# Altium footprint library 2.52-直插元件.PcbLib: 467 footprints (part 15 of 30)
Each footprint in its own frame and in the unit in brackets; x right, y up, seen from the top. Pads: shape width x height; smd on the part's side, far side on the other; paste and mask are expansions set on the pad; w line width, h text height; cw(c..) or ccw(c..) is an arc to the next point about the centre after c.
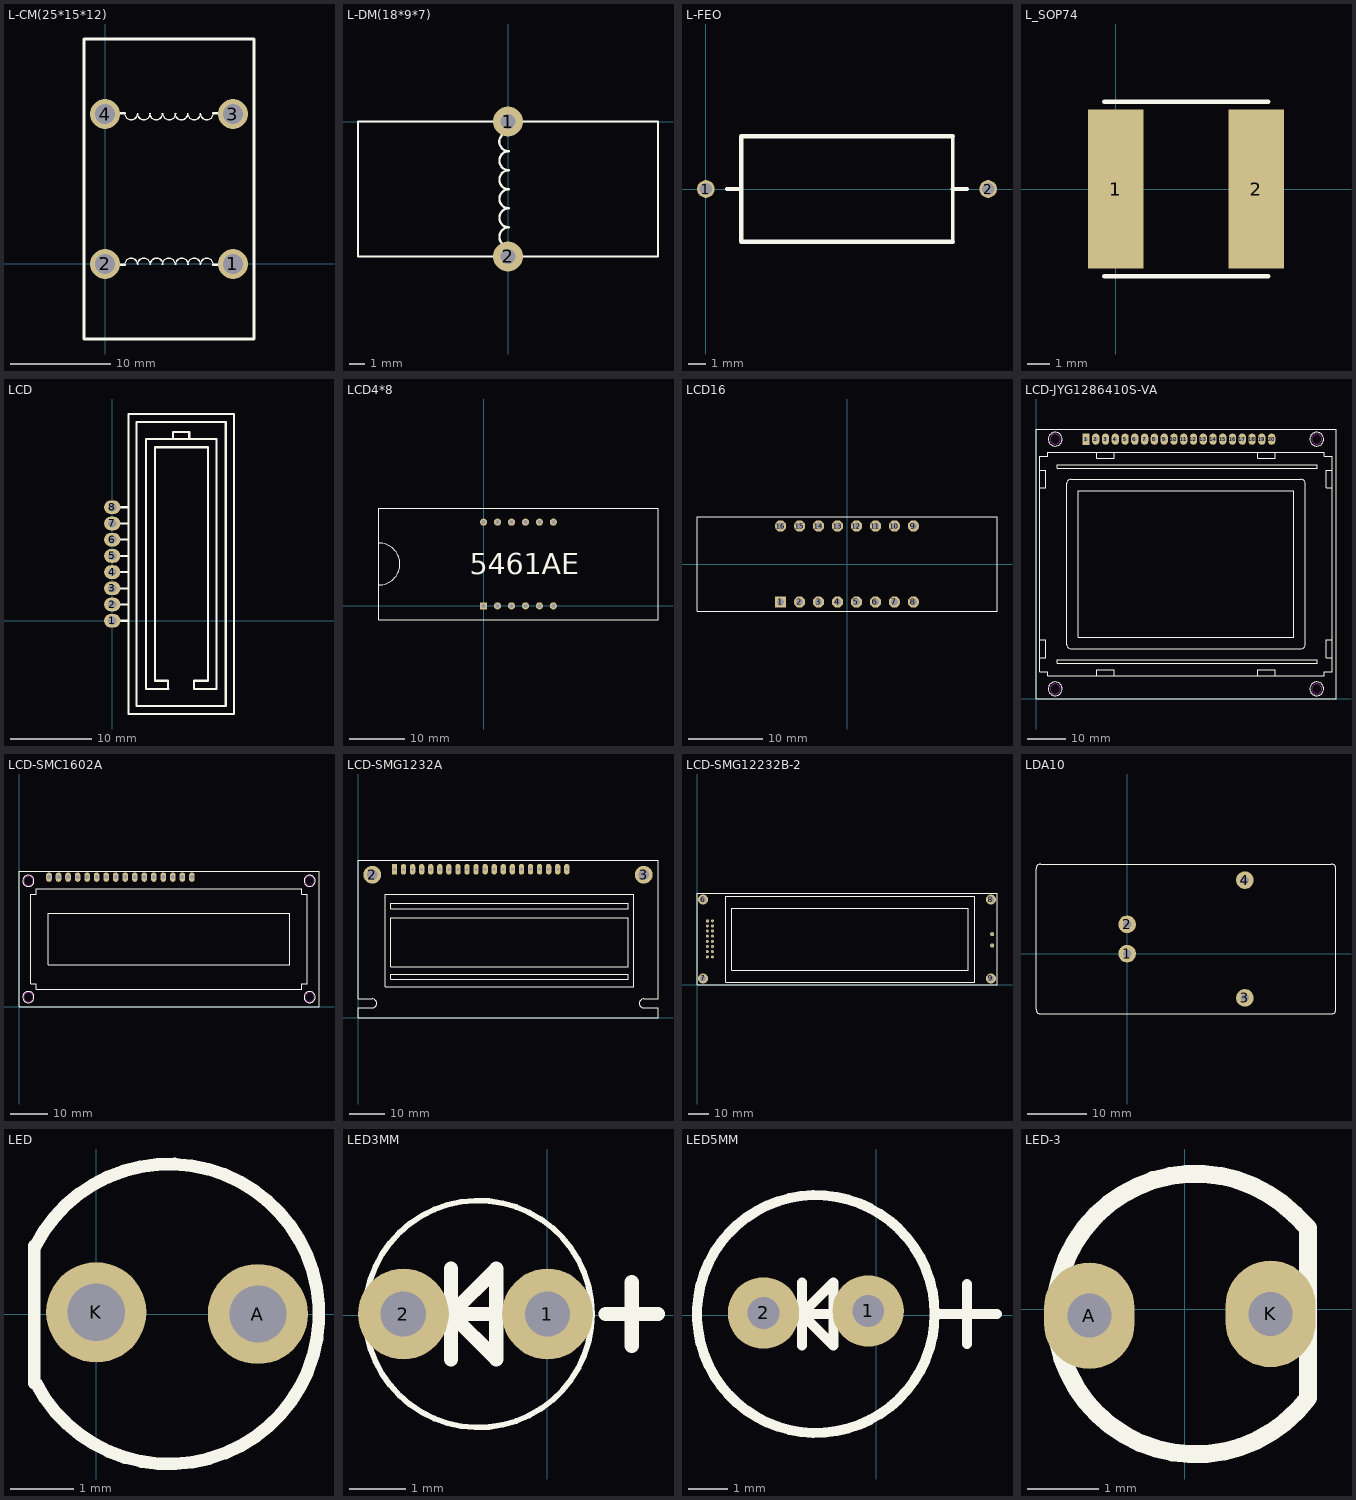
[diagram p14: the footprints below, top view; thin cyan lines are the x and y axes]

## L-CM(25*15*12) [mm]
pads (4):
  round 3 hole 2: 1(12.8,0) 2(0,0) 3(12.8,15) 4(0,15)
Top Overlay:
  lines w0.15: 1.981,-0.058 cw(c2.616,-0.058) 3.251,-0.058 ; 1.981,15.058 ccw(c2.616,15.058) 3.251,15.058 ; 3.25,-0.058 cw(c3.885,-0.058) 4.52,-0.058 ; 3.25,15.058 ccw(c3.885,15.058) 4.52,15.058 ; 4.472,15.06 ccw(c5.107,15.06) 5.742,15.06 ; 4.519,-0.059 cw(c5.154,-0.059) 5.789,-0.059 ; 5.741,-0.059 cw(c6.376,-0.059) 7.011,-0.059 ; 5.789,15.059 ccw(c6.424,15.059) 7.059,15.059 ; 7.011,15.059 ccw(c7.646,15.059) 8.281,15.059 ccw(c8.915,15.058) 9.55,15.058 ; 7.058,-0.06 cw(c7.693,-0.06) 8.328,-0.06 ; 8.28,-0.058 cw(c8.915,-0.058) 9.55,-0.058 ; 9.549,-0.058 cw(c10.184,-0.058) 10.819,-0.058 ; 9.549,15.058 ccw(c10.184,15.058) 10.819,15.058
  lines w0.254: 0.058,-0.058 1.981,-0.058 ; 0.058,15.058 1.981,15.058 ; 10.819,-0.058 12.742,-0.058 ; 10.819,15.058 12.742,15.058 ; -2.1,-7.5 14.9,-7.5 14.9,22.5 -2.1,22.5 -2.1,-7.5
3D body "零?": height 27, standoff -5, extent -2.1,-7.002 14.9,22.002

## L-DM(18*9*7) [mm]
pads (2):
  round 2 hole 1: 1(0,0) 2(0,-9)
Top Overlay:
  lines w0.15: 0.057,-1.982 cw(c0.057,-1.347) 0.057,-0.712 ; 0.059,-7.059 cw(c0.059,-6.424) 0.059,-5.789 cw(c0.059,-5.154) 0.059,-4.519 ; 0.058,-4.52 cw(c0.058,-3.885) 0.058,-3.25 ; 0.058,-3.251 cw(c0.058,-2.616) 0.058,-1.981 ; 0.06,-8.328 cw(c0.06,-7.693) 0.06,-7.058 ; -10,-9 -10,0 10,0 10,-9 -10,-9
3D body "变?": height 16.27, standoff -5.58, extent -8.775,-9.446 8.775,0.446

## L-FEO [mm]
pads (2):
  round 1 hole 0.7: 1(0,0) 2(16,0)
Top Overlay:
  lines w0.2: 14,-3 14,3
  lines w0.254: 1.2,0 2,0 ; 14,-3 2,-3 2,3 14,3 ; 14,0 14.8,0

## L_SOP74 [mm]
pads (2):
  rect 2.5x7.2 smd: 1(0,0) 2(6.35,0)
Top Overlay:
  lines w0.203: -0.508,-3.937 6.892,-3.937 ; -0.508,3.937 6.892,3.937

## LCD [mm]
pads (8):
  oval 2x1.7 hole 1: 1(0,0) 2(0,2) 3(0,4) 4(0,6) 5(0,8) 6(0,10) 7(0,12) 8(0,14)
Top Layer:
  lines w0.6: -0.103,13.6 -0.003,13.5 ; -0.103,14.5 0.397,14.5
Top Overlay:
  lines w0.254: 0,0 2,0 ; 0,2 2,2 ; 0,4 2,4 ; 0,6 2,6 ; 0,8 2,8 ; 0,10 2,10 ; 0,12 2,12 ; 0,14 2,14 ; 6.9,-8.4 6.9,-8.31 6.9,-7.4 6.5,-7.4 5.3,-7.4 5.3,21.4 11.8,21.4 11.8,-7.4 10.1,-7.4 10.1,-8.41 12.845,-8.41 12.845,22.41 4.155,22.41 4.155,-8.41 6.91,-8.41 ; 7.5,22.41 7.5,23.3 9.5,23.3 9.5,22.41 ; 2,-11.5 2,25.5 15,25.5 15,-11.5 2,-11.5 ; 3,-10.5 3,24.5 14,24.5 14,-10.5 3,-10.5

## LCD4*8 [mm]
pads (12):
  rect 1.3x1.3 hole 0.7: 1(0,0)
  round 1.3 hole 0.7: 2(2.54,0) 3(5.08,0) 4(7.62,0) 5(10.16,0) 6(12.7,0) 7(12.7,15.24) 8(10.16,15.24) 9(7.62,15.24) 10(5.08,15.24) 11(2.54,15.24) 12(0,15.24)
Top Overlay:
  lines w0.15: -19.05,3.81 ccw(c-19.05,7.62) -19.05,11.43 ; -19.05,-2.54 31.75,-2.54 31.75,17.78 -19.05,17.78 -19.05,-2.54
  text "5461AE" at -2.54,5.715 h3.81
3D body "User Library-ldq-n516r1.step": height 8, standoff -3.5, extent -18.8,-1.88 31.5,17.12

## LCD16 [mil]
pads (16):
  rect 60x60 hole 35.43: 1(-350,-200)
  round 60 hole 35.43: 2(-250,-200) 3(-150,-200) 4(-50,-200) 5(50,-200) 6(150,-200) 7(250,-200) 8(350,-200) 9(350,200) 10(250,200) 11(150,200) 12(50,200) 13(-50,200) 14(-150,200) 15(-250,200) 16(-350,200)
Top Overlay:
  lines w5.91: -790,-250 -790,250 790,250 790,0 790,-250 -790,-250
3D body "User Library-ltc-4727jr.step": height 275.59, standoff -133.86, extent -790.94,-251.97 790.94,251.97

## LCD-JYG1286410S-VA [mm]
pads (20):
  rect 1.905x2.921 hole 1.1: 1(13,67.46)
  oval 1.905x2.921 hole 1.1: 2(15.54,67.46) 3(18.08,67.46) 4(20.62,67.46) 5(23.16,67.46) 6(25.7,67.46) 7(28.24,67.46) 8(30.78,67.46) 9(33.32,67.46) 10(35.86,67.46) 11(38.4,67.46) 12(40.94,67.46) 13(43.48,67.46) 14(46.02,67.46) 15(48.56,67.46) 16(51.1,67.46) 17(53.64,67.46) 18(56.18,67.46) 19(58.72,67.46) 20(61.26,67.46)
Top Overlay:
  circle w0.15: c73,2.54 r1.8
  circle w0.15: c73,67.46 r1.8
  circle w0.15: c5,2.54 r1.8
  circle w0.15: c5,67.46 r1.8
  lines w0.15: 1,10.668 2.516,10.668 2.516,15.24 1,15.24 ; 1.016,54.864 2.532,54.864 2.532,59.436 1.016,59.436 ; 15.748,6 15.748,7.516 20.32,7.516 20.32,6 ; 15.748,64 15.748,62.484 20.32,62.484 20.32,64 ; 57.68,6 57.68,7.516 62.252,7.516 62.252,6 ; 57.68,64 57.68,62.484 62.252,62.484 62.252,64 ; 76.984,54.864 75.468,54.864 75.468,59.436 76.984,59.436 ; 77,10.668 75.484,10.668 75.484,15.24 77,15.24 ; 0,0 0,70 78,70 78,0 0,0 ; 1,7 1,63 3,63 3,64 75,64 75,63 77,63 77,7 75,7 75,6 3,6 3,7 1,7 ; 5.588,9.144 73.152,9.144 73.152,10.16 5.588,10.16 5.588,9.144 ; 5.588,59.84 73.152,59.84 73.152,60.856 5.588,60.856 5.588,59.84 ; 8,14 ccw(c9,14) 9,13 69,13 ccw(c69,14) 70,14 70,56 ccw(c69,56) 69,57 9,57 ccw(c9,56) 8,56 8,14 ; 11,16 67,16 67,54 11,54 11,16
Keep-Out Layer:
  circle w0.15: c73,2.54 r1.3
  circle w0.15: c73,67.46 r1.3
  circle w0.15: c5,67.46 r1.3
  circle w0.15: c5,2.54 r1.3
3D body "User_Library-jm12864a.step": height 7, standoff -8.4, extent 0,0 78,70

## LCD-SMC1602A [mm]
pads (16):
  oval 1.5x2.5 hole 1: 1(8.001,34.5) 2(10.541,34.5) 3(13.081,34.5) 4(15.621,34.5) 5(18.161,34.5) 6(20.701,34.5) 7(23.241,34.5) 8(25.781,34.5) 9(28.321,34.5) 10(30.861,34.5) 11(33.401,34.5) 12(35.941,34.5) 13(38.481,34.5) 14(41.021,34.5) 15(43.561,34.5) 16(46.101,34.5)
Top Overlay:
  circle w0.15: c2.5,2.5 r1.5
  circle w0.15: c2.5,33.5 r1.5
  circle w0.15: c77.5,2.5 r1.5
  circle w0.15: c77.5,33.5 r1.5
  lines w0.15: 0,0 80,0 80,36 0,36 0,0 ; 3.15,6.1 3.15,29.9 4.65,29.9 4.65,31.4 75.35,31.4 75.35,29.9 76.85,29.9 76.85,6.1 75.35,6.1 75.35,4.6 4.65,4.6 4.65,6.1 3.15,6.1 ; 7.75,11.1 72.25,11.1 72.25,24.9 7.75,24.9 7.75,11.1
Keep-Out Layer:
  circle w0.15: c2.5,2.5 r1.25
  circle w0.15: c2.5,33.5 r1.25
  circle w0.15: c77.5,2.5 r1.25
  circle w0.15: c77.5,33.5 r1.25
3D body "User Library-SEETRON GLO-216Y-G.step": height 6.17, standoff -9.17, extent 0,0 80,36

## LCD-SMG1232A [mm]
pads (22):
  rect 1.5x3 hole 0.8: 1(10.2,41.5)
  round 5 hole 3: 2(4,40) 3(80,40)
  oval 1.5x3 hole 0.8: 2(12.74,41.5) 3(15.28,41.5) 4(17.82,41.5) 5(20.36,41.5) 6(22.9,41.5) 7(25.44,41.5) 8(27.98,41.5) 9(30.52,41.5) 10(33.06,41.5) 11(35.6,41.54) 12(38.14,41.54) 13(40.68,41.54) 14(43.22,41.54) 15(45.76,41.54) 16(48.3,41.54) 17(50.84,41.54) 18(53.38,41.54) 19(55.92,41.54) 20(58.46,41.54)
Top Overlay:
  lines w0.15: 0,0 84,0 84,2.75 80,2.75 cw(c80,4) 80,5.25 84,5.25 84,44 0,44 0,5.25 4,5.25 cw(c4,4) 4,2.75 0,2.75 0,0 ; 7.62,8.636 7.62,34.544 77.216,34.544 77.216,8.636 7.62,8.636 ; 9.144,10.668 75.692,10.668 75.692,12.192 9.144,12.192 9.144,10.668 ; 9.144,14.224 75.692,14.224 75.692,27.94 9.144,27.94 9.144,14.224 ; 9.144,30.48 75.692,30.48 75.692,32.004 9.144,32.004 9.144,30.48
3D body "User Library-AC162B.step": height 18, standoff -18, extent 1.721,23.606 81.721,37.506

## LCD-SMG12232B-2 [mm]
pads (22):
  rect 1.5x1.5 hole 0.8: 1(5.08,31.496)
  round 1.5 hole 0.8: 2(7.62,31.496) 3(5.08,28.956) 4(7.62,28.956) 5(5.08,26.416) 6(7.62,26.416) 7(5.08,23.876) 8(7.62,23.876) 9(5.08,21.336) 10(7.62,21.336) 11(5.08,18.796) 12(7.62,18.796) 13(5.08,16.256) 14(7.62,16.256) 15(5.08,13.716) 16(7.62,13.716)
  round 2 hole 1: 4(145.796,24.892) 5(145.796,19.304)
  round 5 hole 3: 6(3,42) 7(3,3) 8(145.2,42) 9(145.2,3)
Top Overlay:
  lines w0.15: 0,0 148.2,0 148.2,45 0,45 0,0 ; 14.224,1.016 137.16,1.016 137.16,43.688 14.224,43.688 14.224,1.016 ; 17.272,7.112 17.272,37.592 134.112,37.592 134.112,7.112 17.272,7.112
3D body "User Library-Display20x2.step": height 5.03, standoff -4.57, extent 15.536,3.94 131.614,41.278

## LDA10 [mm]
pads (4):
  round 3 hole 1.5: 1(0,0) 2(0,5) 3(20,-7.5) 4(20,12.5)
Top Overlay:
  lines w0.1: -15.5,-9.453 ccw(c-14.703,-9.453) -14.703,-10.25 34.703,-10.25 ccw(c34.703,-9.453) 35.5,-9.453 35.5,14.453 ccw(c34.703,14.453) 34.703,15.25 -14.703,15.25 ccw(c-14.703,14.453) -15.5,14.453 -15.5,-9.453

## LED [mil]
pads (2):
  round 62 hole 35.43: A(100,0) K(0,1)
Top Overlay:
  lines w7.87: -38.34,-42.75 -38.34,42.08 ; -37.62,42.22 cw(c45,0) -37.34,-42.75

## LED3MM [mm]
pads (2):
  round 1.6 hole 0.8: 1(0,0.025) 2(-2.54,0.025)
Top Overlay:
  circle w0.1: c-1.216,0.025 r2
  lines w0.254: -1.7,-0.775 -1.7,0.025 ; -1.7,0.825 -1.7,0.025 ; -0.686,0.025 -1.7,0.025 ; 1.024,0.025 1.948,0.025 ; 1.486,-0.537 1.486,0.587 ; -1.7,0.025 -0.9,0.825 -0.9,-0.775 -1.7,0.025
3D body "LED3_GRE.STEP": height 5.33, standoff -1.87, extent -2.878,-2.032 0.642,1.965

## LED5MM [mm]
pads (2):
  round 1.8 hole 0.8: 1(-0.203,0.102) 2(-2.845,0.051)
Top Overlay:
  circle w0.254: c-1.524,0.025 r3
  lines w0.254: -2.134,0.025 -0.889,0.025 ; -1.878,-0.775 -1.878,0.025 ; -1.878,0.825 -1.878,0.025 ; 1.524,0.025 3.048,0.025 ; 2.286,-0.737 2.286,0.787 ; -1.878,0.025 -1.078,-0.775 -1.078,0.825 -1.878,0.025
3D body "LED5_RED.STEP": height 8.73, standoff -1.87, extent -4.064,-2.799 1.286,2.901

## LED-3 [mm] "淘宝ID:黄晶宝石"
pads (2):
  oval 1.27x1.5 hole 0.62: A(-1.346,-0.089) K(1.206,-0.064)
Top Overlay:
  lines w0.254: 1.548,1.332 ccw(c0.151,-0.065) 1.732,-1.25 1.732,1.149 1.548,1.332